# Altium footprint library 15.Switches&Relay.PcbLib: 33 footprints (part 1 of 3)
Each footprint in its own frame and in the unit in brackets; x right, y up, seen from the top. Pads: shape width x height; smd on the part's side, far side on the other; paste and mask are expansions set on the pad; w line width, h text height; cw(c..) or ccw(c..) is an arc to the next point about the centre after c.
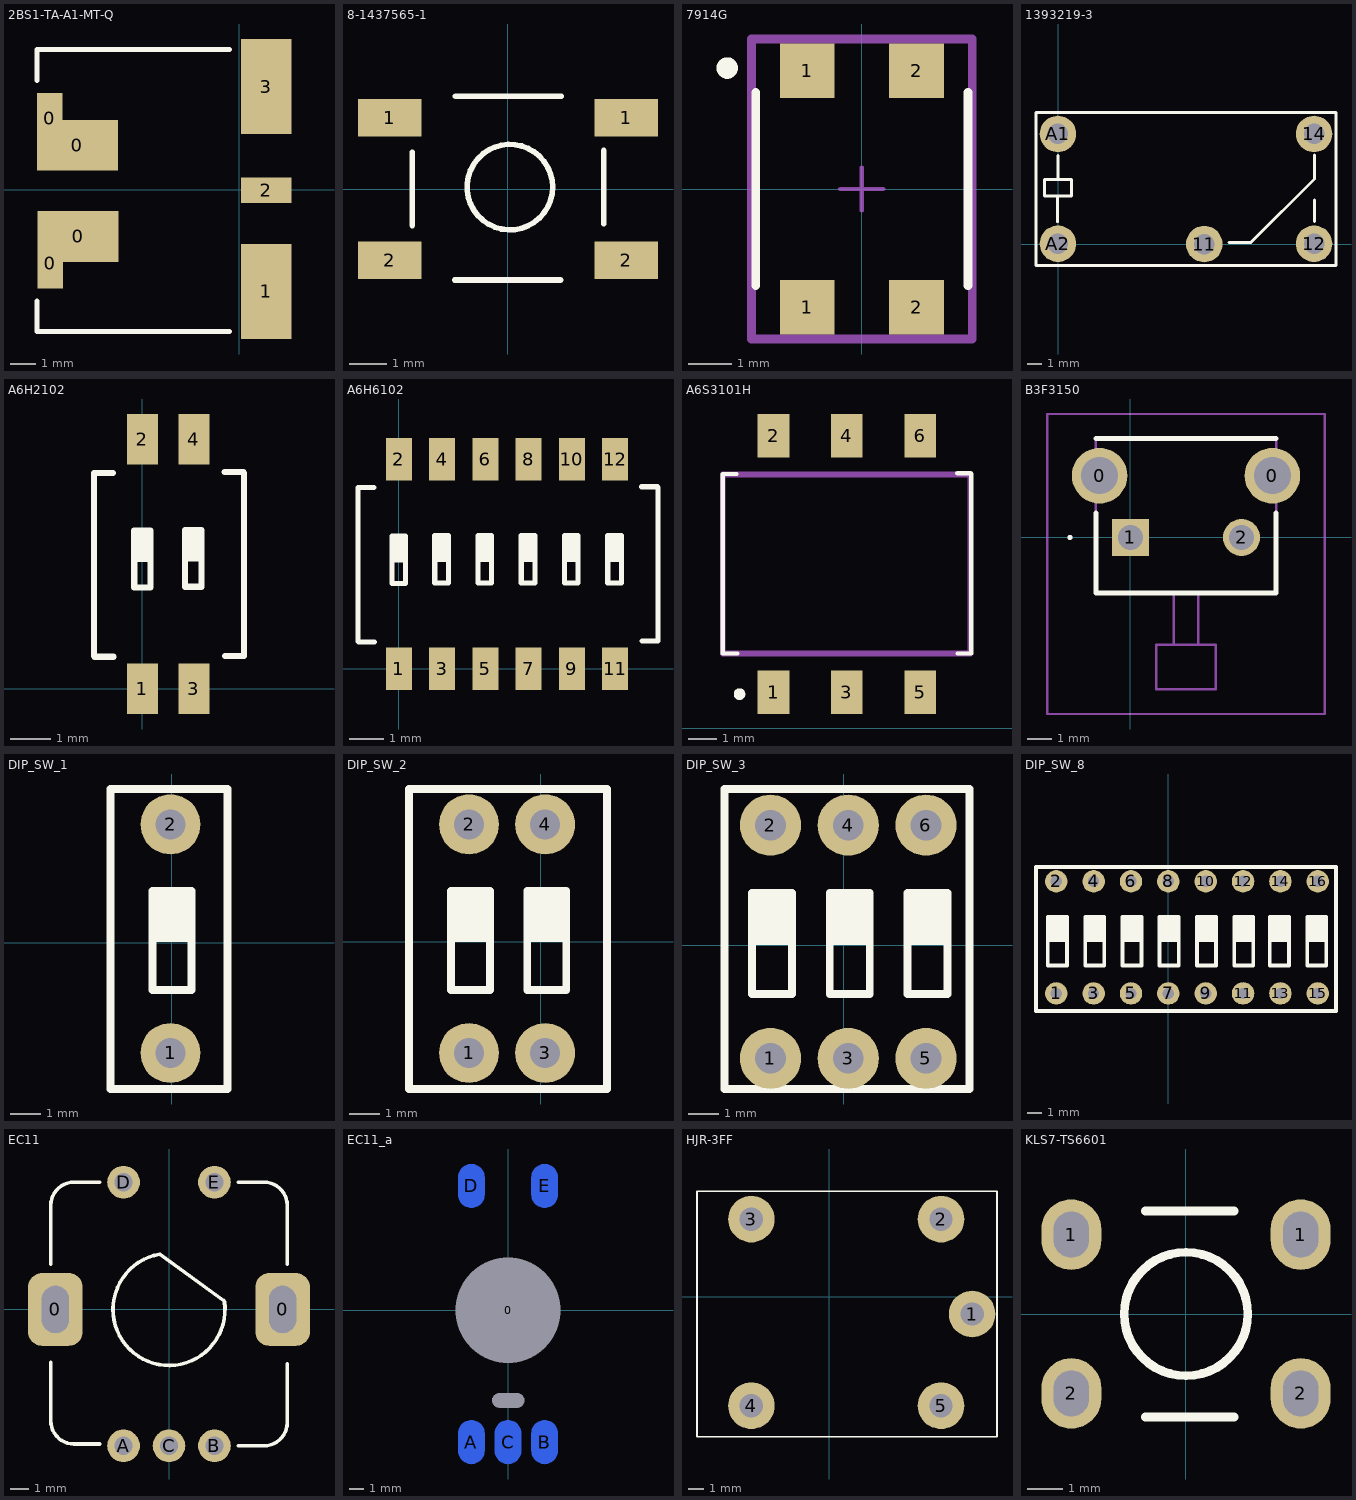
[diagram p0: the footprints below, top view; thin cyan lines are the x and y axes]

## 2BS1-TA-A1-MT-Q [mm]
pads (7):
  rect 1.02x2.03 smd: 0(-7.6,2.85) 0(-7.575,-2.95)
  rect 3.25x2.03 smd: 0(-6.485,1.775) 0(-6.46,-1.875)
  rect 2.03x3.81 smd: 1(1.075,-4.075) 3(1.075,4.125)
  rect 2.03x1.02 smd: 2(1.075,-0.025)
Top Overlay:
  lines w0.2: -8.1,-5.675 -0.4,-5.675 ; -8.1,-5.65 -8.1,-4.45 ; -8.1,4.375 -8.1,5.575 ; -8.1,5.6 -0.4,5.6

## 8-1437565-1 [mm]
pads (4):
  rect 1.7x1 smd: 1(-3.15,1.9) 1(3.15,1.9) 2(-3.15,-1.9) 2(3.15,-1.9)
Top Overlay:
  circle w0.15: c0.05,0.05 r1.14
  lines w0.15: -2.55,-0.975 -2.55,0.975 ; -1.425,-2.425 1.4,-2.425 ; -1.4,2.475 1.425,2.475 ; 2.55,-0.925 2.55,1.025
3D body "User Library-SMD button 5x5x1_5.step": height 1.5, standoff 0, extent -3.5,-2.55 3.45,2.55

## 7914G [mm]
pads (4):
  rect 1.27x1.27 smd paste+0 mask+0: 1(-1.27,-2.75) 1(-1.27,2.75) 2(1.27,-2.75) 2(1.27,2.75)
Top Overlay:
  circle w0.25: c-3.13,2.81 r0.125
  lines w0.2: -2.465,-2.25 -2.465,2.25 ; 2.465,-2.25 2.465,2.25
Mechanical 10:
  lines w0.2: -2.565,-3.485 2.565,-3.485 2.565,3.485 -2.565,3.485 -2.565,-3.485
  text ".Designator" at 0,0 h1
Mechanical 15:
  lines w0.1: -0.5,0 0.5,0 ; 0,-0.5 0,0.5
  lines w0.2: -2.565,-3.485 2.565,-3.485 2.565,3.485 -2.565,3.485 -2.565,-3.485
3D body "Switch_Bourns_7914G-1-000E_eec.STEP": height 4.54, standoff 0, extent -2.465,-3.1 2.465,3.1

## 1393219-3 [mm]
pads (5):
  round 2.5 hole 1.4: 11(9.975,0) 12(17.475,0.025) 14(17.475,7.525) A1(-0.025,7.525) A2(-0.025,0.025)
Top Overlay:
  lines w0.2: -0.05,1.525 -0.05,3.175 ; -0.025,6.05 -0.025,4.4 -0.95,4.4 -0.95,3.275 0.9,3.275 0.9,4.4 0.025,4.4 ; 11.65,0.1 13.15,0.1 17.5,4.45 17.5,5.15 ; 17.5,1.55 17.5,3 ; 17.5,4.925 17.5,6.075 ; 18.825,9 18.975,9 18.975,-1.475 -1.525,-1.475 -1.525,9 18.85,9
3D body "RELAY5-PE_CO.step": height 10.01, standoff 0, extent -1.29,-1.179 18.7,8.829

## A6H2102 [mm]
pads (4):
  rect 0.76x1.25 smd: 1(0,0) 2(0,6.15) 3(1.27,0) 4(1.27,6.15)
Top Overlay:
  lines w0.15: -0.724,5.32 -1.199,5.32 -1.199,0.806 -1.179,0.786 -0.717,0.786 ; -0.11,3.826 -0.025,3.818 -0.076,3.299 -0.202,3.897 ; 0.062,3.289 0.092,3.813 0.198,3.197 -0.202,3.197 -0.202,3.897 ; 1.146,3.842 1.231,3.834 1.18,3.316 1.054,3.914 ; 1.318,3.305 1.348,3.829 1.454,3.214 1.054,3.214 1.054,3.914 ; 2.027,5.344 2.489,5.344 ; 2.034,0.81 2.509,0.81 2.509,5.325 ; -0.202,3.897 -0.202,2.497 0.198,2.497 0.198,3.897 -0.202,3.897 ; 1.054,3.914 1.054,2.514 1.454,2.514 1.454,3.914 1.054,3.914
3D body: height 2, standoff 0, extent -1.21,0.813 2.5,5.313
3D body: height 2.3, standoff 2, extent -0.3,2.4 0.3,3.3
3D body: height 2.3, standoff 2, extent 1,2.4 1.6,3.3

## A6H6102 [mm]
pads (12):
  rect 0.76x1.25 smd: 1(0,0) 2(0,6.15) 3(1.27,0) 4(1.27,6.15) 5(2.54,0) 6(2.54,6.15) 7(3.81,0) 8(3.81,6.15) 9(5.08,0) 10(5.08,6.15) 11(6.35,0) 12(6.35,6.15)
Top Overlay:
  lines w0.15: -0.724,5.32 -1.199,5.32 -1.199,0.806 -1.179,0.786 -0.717,0.786 ; -0.11,3.826 -0.025,3.818 -0.076,3.299 -0.202,3.897 ; 0.062,3.289 0.092,3.813 0.198,3.197 -0.202,3.197 -0.202,3.897 ; 1.146,3.842 1.231,3.834 1.18,3.316 1.054,3.914 ; 1.318,3.305 1.348,3.829 1.454,3.214 1.054,3.214 1.054,3.914 ; 2.416,3.842 2.501,3.834 2.45,3.316 2.324,3.914 ; 2.588,3.305 2.618,3.829 2.724,3.214 2.324,3.214 2.324,3.914 ; 3.686,3.842 3.771,3.834 3.72,3.316 3.594,3.914 ; 3.858,3.305 3.888,3.829 3.994,3.214 3.594,3.214 3.594,3.914 ; 4.956,3.842 5.041,3.834 4.99,3.316 4.864,3.914 ; 5.128,3.305 5.158,3.829 5.264,3.214 4.864,3.214 4.864,3.914 ; 6.226,3.842 6.311,3.834 6.26,3.316 6.134,3.914 ; 6.398,3.305 6.428,3.829 6.534,3.214 6.134,3.214 6.134,3.914 ; 7.127,5.344 7.589,5.344 ; 7.134,0.81 7.609,0.81 7.609,5.325 ; -0.202,3.897 0.198,3.897 0.198,2.497 -0.202,2.497 -0.202,3.897 ; 1.054,3.914 1.454,3.914 1.454,2.514 1.054,2.514 1.054,3.914 ; 2.324,3.914 2.724,3.914 2.724,2.514 2.324,2.514 2.324,3.914 ; 3.594,3.914 3.994,3.914 3.994,2.514 3.594,2.514 3.594,3.914 ; 4.864,3.914 5.264,3.914 5.264,2.514 4.864,2.514 4.864,3.914 ; 6.134,3.914 6.534,3.914 6.534,2.514 6.134,2.514 6.134,3.914
3D body: height 2.3, standoff 2, extent 6.1,2.4 6.7,3.3
3D body: height 2.3, standoff 2, extent 4.8,2.4 5.4,3.3
3D body: height 2.3, standoff 2, extent 3.5,2.4 4.1,3.3
3D body: height 2.3, standoff 2, extent 2.3,2.4 2.9,3.3
3D body: height 2.3, standoff 2, extent 1,2.4 1.6,3.3
3D body: height 2.3, standoff 2, extent -0.3,2.4 0.3,3.3
3D body: height 2, standoff 0, extent -1.21,0.813 7.59,5.313

## A6S3101H [mm]
pads (6):
  rect 1.1x1.5 smd: 1(8.46,1.25) 2(8.46,10.15) 3(11,1.25) 4(11,10.15) 5(13.54,1.25) 6(13.54,10.15)
Top Overlay:
  lines w0.15: 6.701,2.6 6.701,8.82 7.176,8.82 ; 6.735,2.598 7.21,2.598 ; 14.827,8.844 15.289,8.844 ; 14.834,2.6 15.309,2.6 15.309,8.825
  lines w0.2: 7.278,1.088 ccw(c7.278,1.188) 7.278,1.288 ccw(c7.278,1.188) 7.278,1.088
Mechanical 13:
  lines w0.2: 6.7,2.6 6.7,8.8 15.28,8.8 15.28,2.6 6.7,2.6
3D body: height 2, standoff 0, extent 6.69,2.6 15.3,8.813
3D body: height 2.3, standoff 2, extent 13.15,6.1 14.05,7.4
3D body: height 2.3, standoff 2, extent 10.601,6.123 11.501,7.423
3D body: height 2.3, standoff 2, extent 8.001,6.123 8.901,7.423

## B3F3150 [mm]
pads (4):
  round 2.25 hole 1.5: 0(-1.25,2.5) 0(5.75,2.5)
  rect 1.5x1.5 hole 1: 1(0,0)
  round 1.5 hole 1: 2(4.5,0)
Top Overlay:
  lines w0.1: -2.5,0 ccw(c-2.45,0) -2.4,0 ccw(c-2.45,0) -2.5,0
  lines w0.2: -1.4,1 -1.4,-2.25 5.9,-2.25 5.9,1 ; -1.4,4 5.9,4
Mechanical 13:
  lines w0.1: 1.75,-2.25 1.75,-4.35 ; 2.75,-2.25 2.75,-4.35 ; 1.75,-4.35 1.05,-4.35 1.05,-6.15 3.45,-6.15 3.45,-4.35 2.75,-4.35 ; 1.75,-4.35 2.75,-4.35 ; -1.4,-2.25 -1.4,4 5.9,4 5.9,-2.25 -1.4,-2.25
Mechanical 15:
  lines w0.1: -3.375,-7.15 -3.375,5 7.875,5 7.875,-7.15 -3.375,-7.15

## DIP_SW_1 [mm]
pads (2):
  round 2 hole 1: 1(-0.05,-3.675) 2(-0.05,3.945)
Top Overlay:
  rectangle: -0.65,0.025 0.65,1.725
  lines w0.254: 0.65,0.325 0.65,1.725 -0.65,1.725 -0.65,1.125 -0.65,-1.575 0.65,-1.575 0.65,1.125 ; -2.05,-4.875 1.85,-4.875 1.85,5.125 -2.05,5.125 -2.05,-4.875
3D body "DS1040-01 (DIP_switch).stp": height 6.8, standoff -3.85, extent -2.05,-4.865 1.95,5.035

## DIP_SW_2 [mm]
pads (4):
  round 2 hole 1: 1(-2.4,-3.7) 2(-2.4,3.92) 3(0.14,-3.7) 4(0.14,3.92)
Top Overlay:
  rectangle: -3,0 -1.7,1.7
  rectangle: -0.46,0 0.84,1.7
  lines w0.254: -1.7,0.3 -1.7,1.7 -3,1.7 -3,1.1 -3,-1.6 -1.7,-1.6 -1.7,1.1 ; 0.84,0.3 0.84,1.7 -0.46,1.7 -0.46,1.1 -0.46,-1.6 0.84,-1.6 0.84,1.1 ; -4.4,-4.9 2.2,-4.9 2.2,5.1 -4.4,5.1 -4.4,-4.9
3D body "User Library-dips sith 2.step": height 2.7, standoff -7.4, extent -4.5,-4.98 2.342,5.18

## DIP_SW_3 [mm]
pads (6):
  round 2 hole 1: 1(-2.4,-3.7) 2(-2.4,3.92) 3(0.14,-3.7) 4(0.14,3.92) 5(2.68,-3.7) 6(2.68,3.92)
Top Overlay:
  rectangle: -3,0 -1.7,1.7
  rectangle: -0.46,0 0.84,1.7
  rectangle: 2.08,0 3.38,1.7
  lines w0.254: -1.7,0.3 -1.7,1.7 -3,1.7 -3,1.1 -3,-1.6 -1.7,-1.6 -1.7,1.1 ; 0.84,0.3 0.84,1.7 -0.46,1.7 -0.46,1.1 -0.46,-1.6 0.84,-1.6 0.84,1.1 ; 3.38,0.3 3.38,1.7 2.08,1.7 2.08,1.1 2.08,-1.6 3.38,-1.6 3.38,1.1 ; -3.9,-4.7 4,-4.7 4.1,-4.7 4.1,5.1 -3.9,5.1 -3.9,-4.7
3D body "User Library-switch 3.step": height 9, standoff -1.7, extent -4.167,-4.8 3.967,5.1

## DIP_SW_8 [mil]
pads (16):
  round 60 hole 30: 1(-300,500) 2(-300,800) 3(-200,500) 4(-200,800) 5(-100,500) 6(-100,800) 7(0,500) 8(0,800) 9(100,500) 10(100,800) 11(200,500) 12(200,800) 13(300,500) 14(300,800) 15(400,500) 16(400,800)
Top Overlay:
  rectangle: -322.83,637.8 -271.65,704.72
  rectangle: -222.83,637.8 -171.65,704.72
  rectangle: -122.83,637.8 -71.65,704.72
  rectangle: 176.38,637.8 227.56,704.72
  rectangle: 76.38,637.8 127.56,704.72
  rectangle: -23.62,637.8 27.56,704.72
  rectangle: 371.65,637.8 422.83,704.72
  rectangle: 271.65,637.8 322.83,704.72
  lines w10: -271.65,649.61 -271.65,704.72 -322.83,704.72 -322.83,681.1 -322.83,574.8 -271.65,574.8 -271.65,681.1 ; -171.65,649.61 -171.65,704.72 -222.83,704.72 -222.83,681.1 -222.83,574.8 -171.65,574.8 -171.65,681.1 ; -71.65,649.61 -71.65,704.72 -122.83,704.72 -122.83,681.1 -122.83,574.8 -71.65,574.8 -71.65,681.1 ; 27.56,649.61 27.56,704.72 -23.62,704.72 -23.62,681.1 -23.62,574.8 27.56,574.8 27.56,681.1 ; 127.56,649.61 127.56,704.72 76.38,704.72 76.38,681.1 76.38,574.8 127.56,574.8 127.56,681.1 ; 227.56,649.61 227.56,704.72 176.38,704.72 176.38,681.1 176.38,574.8 227.56,574.8 227.56,681.1 ; 322.83,649.61 322.83,704.72 271.65,704.72 271.65,681.1 271.65,574.8 322.83,574.8 322.83,681.1 ; 422.83,649.61 422.83,704.72 371.65,704.72 371.65,681.1 371.65,574.8 422.83,574.8 422.83,681.1 ; -354.33,452.76 444.88,452.76 448.82,452.76 448.82,838.58 -354.33,838.58 -354.33,452.76
3D body "User Library-DIPSWITCH8.step": height 271.65, standoff -125.98, extent -381.89,449.61 480.31,849.61

## EC11 [mm]
pads (7):
  rrect50% 3x4 hole 1.5 slot 2.6 at 90 deg: 0(-6.25,0) 0(6.25,0)
  round 1.8 hole 1: A(-2.5,-7.5) B(2.5,-7.5) C(0,-7.5) D(-2.5,7) E(2.5,7)
Top Overlay:
  lines w0.2: -6.5,-2.9 -6.5,-6.13 ccw(c-5.23,-6.13) -5.23,-7.4 -3.8,-7.4 ; -6.5,2.5 -6.5,5.73 cw(c-5.23,5.73) -5.23,7 -3.8,7 ; -0.523,3.036 ccw(c0,0) 3.054,0.407 ; -0.478,3.03 3,0.5 ; 3.8,-7.5 5.23,-7.5 ccw(c5.23,-6.23) 6.5,-6.23 6.5,-3 ; 3.8,7 5.23,7 cw(c5.23,5.73) 6.5,5.73 6.5,2.5
3D body "EC11_Rotary_Encoder_Switched.step": height 2.93, standoff -27.15, extent -6.545,-7.93 6.545,7.33
3D body "User Library-Eagle Plastic Devices 45KN018-GRX.step": height 27.51, standoff 16, extent -14.059,-13.763 13.669,13.964

## EC11_a [mm]
pads (7):
  round 1 hole 7.2: 0(0,0)
  round 0.2 hole 2.2 slot 1 at 90 deg: 0(0.021,-6.152)
  rrect100% 1.8x3 smd far side: A(-2.5,-9) B(2.5,-9) C(0,-9) D(-2.5,8.5) E(2.5,8.5)
Bottom Overlay:
  lines w0.2: -3.8,-7.4 -5.23,-7.4 cw(c-5.23,-6.13) -6.5,-6.13 -6.5,2.5 -6.5,5.73 cw(c-5.23,5.73) -5.23,7 -3.8,7 ; 3.8,-7.5 5.23,-7.5 ccw(c5.23,-6.23) 6.5,-6.23 6.5,2.75 ; 3.8,7 5.23,7 cw(c5.23,5.73) 6.5,5.73 6.5,2.5
3D body "User Library-Eagle Plastic Devices 45KN018-GRX.step": height 20.01, standoff 8.5, extent -13.863,-13.865 13.865,13.863
3D body "EC11_Rotary_Encoder_Switched.step": height 9.93, standoff -20.15, extent -6.545,-7.93 6.545,7.33

## HJR-3FF [mm]
pads (5):
  round 3 hole 1.5: 1(9.2,-1.1) 2(7.2,5) 3(-5,5) 4(-5,-7) 5(7.2,-7)
Top Overlay:
  lines w0.1: -8.5,-9 -8.5,6.8 10.8,6.8 10.8,-2.4 10.8,-9 -8.5,-9
3D body "User Library-Tianbo Relay ( HJR-3FF-S-Z).step": height 15.51, standoff -2.2, extent -8.4,-8.85 10.6,6.65

## KLS7-TS6601 [mm]
pads (4):
  oval 1.7x2 hole 1 slot 1.3 at 90 deg mask+0.102: 1(-3.25,2.25) 1(3.25,2.25) 2(-3.25,-2.25) 2(3.25,-2.25)
Top Overlay:
  circle w0.254: c0,0 r1.75
  lines w0.254: -1.143,-2.921 1.357,-2.921 ; -1.143,2.921 1.357,2.921
3D body "User Library-TPxxxx (Switch).step": height 5.4, standoff -3.09, extent -4.085,-2.999 3.89,3.001